# Altium footprint library 13-IC Packages-1bga.PcbLib: 97 footprints (part 8 of 14) (continued)
## BGA676C100P26X26_2700X2700X324 [mm] "BGA, 1.00mm Pitch, Square; 676 Pin, 26 Columns X 26 Rows, 27.00mm X 27.00mm X 2.60mm H" (continued)
  round 1 smd paste-0.51 mask+0.5: FTG1(-14.35,-14.35) FTG2(14.35,14.35)
Top Layer keep-out:
  circle w0.1: c-14.35,-14.35 r1
  circle w0.1: c14.35,14.35 r1
Top Overlay:
  circle w0.25: c-14.1,12.5 r0.125
  lines w0.2: -13.5,12.5 -12.5,13.5 ; -13.5,12.7 -12.7,13.5 ; -13.5,12.9 -12.9,13.5 ; -13.5,13.1 -13.1,13.5 ; -13.5,13.3 -13.3,13.5 ; -13.5,-13.5 13.5,-13.5 13.5,13.5 -13.5,13.5 -13.5,-13.5
Mechanical 14:
  lines w0.1: -13.5,12.5 -12.5,13.5 ; -13.5,12.6 -12.6,13.5 ; -13.5,12.7 -12.7,13.5 ; -13.5,12.8 -12.8,13.5 ; -13.5,12.9 -12.9,13.5 ; -13.5,13 -13,13.5 ; -13.5,13.1 -13.1,13.5 ; -13.5,13.2 -13.2,13.5 ; -13.5,13.3 -13.3,13.5 ; -13.5,13.4 -13.4,13.5 ; -13.5,-13.5 13.5,-13.5 13.5,13.5 -13.5,13.5 -13.5,-13.5
  text "26" at 12.7,14 h0.6
  text "25" at 11.7,14 h0.6
  text "24" at 10.7,14 h0.6
  text "23" at 9.7,14 h0.6
  text "2" at -11.25,14 h0.6
  text "3" at -10.25,14 h0.6
  text "4" at -9.25,14 h0.6
  text "5" at -8.25,14 h0.6
  text "16" at 2.75,14 h0.6
  text "15" at 1.75,14 h0.6
  text "14" at 0.75,14 h0.6
  text "13" at -0.25,14 h0.6
  text "12" at -1.25,14 h0.6
  text "11" at -2.25,14 h0.6
  text "10" at -3.25,14 h0.6
  text "9" at -4.25,14 h0.6
  text "8" at -5.25,14 h0.6
  text "7" at -6.25,14 h0.6
  text "6" at -7.25,14 h0.6
  text "1" at -12.25,14 h0.6
  text "18" at 4.75,14 h0.6
  text "19" at 5.75,14 h0.6
  text "20" at 6.75,14 h0.6
  text "21" at 7.75,14 h0.6
  text "22" at 8.7,14 h0.6
  text "17" at 3.75,14 h0.6
  text "AB" at -14.9,-8.8 h0.6
  text "AA" at -14.9,-7.8 h0.6
  text "Y" at -14.4,-6.8 h0.6
  text "W" at -14.4,-5.8 h0.6
  text "V" at -14.4,-4.8 h0.6
  text "U" at -14.4,-3.8 h0.6
  text "T" at -14.4,-2.8 h0.6
  text "R" at -14.4,-1.8 h0.6
  text "P" at -14.4,-0.8 h0.6
  text "N" at -14.4,0.2 h0.6
  text "M" at -14.4,1.2 h0.6
  text "L" at -14.4,2.2 h0.6
  text "K" at -14.4,3.2 h0.6
  text "J" at -14.4,4.2 h0.6
  text "H" at -14.4,5.2 h0.6
  text "G" at -14.4,6.2 h0.6
  text "F" at -14.4,7.2 h0.6
  text "E" at -14.4,8.2 h0.6
  text "D" at -14.4,9.2 h0.6
  text "C" at -14.4,10.2 h0.6
  text "B" at -14.4,11.2 h0.6
  text "A" at -14.4,12.2 h0.6
  text "AC" at -14.9,-9.8 h0.6
  text "AD" at -14.9,-10.8 h0.6
  text "AE" at -14.9,-11.8 h0.6
  text "AF" at -14.9,-12.8 h0.6
Mechanical 15:
  lines w0.05: -0.5,0 0.5,0 ; 0,-0.5 0,0.5 ; -15.5,-15.5 15.5,-15.5 15.5,15.5 -15.5,15.5 -15.5,-15.5
3D body "BGA676C100P26X26_2700X2700X324.stp": height 3.24, standoff 0, extent -13.5,-13.5 13.5,13.5

## BGA841C80P29X29_2400X2400X342 [mm] "BGA, 0.80mm pitch,square;841 pin, 29 columns X 29 rows, 24.00mm X 24.00mm X 3.42mm H"
height 3.42
pads (843):
  round 0.45 smd: A1(-11.2,11.2) A2(-10.4,11.2) A3(-9.6,11.2) A4(-8.8,11.2) A5(-8,11.2) A6(-7.2,11.2) A7(-6.4,11.2) A8(-5.6,11.2) A9(-4.8,11.2) A10(-4,11.2) A11(-3.2,11.2) A12(-2.4,11.2) A13(-1.6,11.2) A14(-0.8,11.2) A15(0,11.2) A16(0.8,11.2) A17(1.6,11.2) A18(2.4,11.2) A19(3.2,11.2) A20(4,11.2) A21(4.8,11.2) A22(5.6,11.2) A23(6.4,11.2) A24(7.2,11.2) A25(8,11.2) A26(8.8,11.2) A27(9.6,11.2) A28(10.4,11.2) A29(11.2,11.2) AA1(-11.2,-4.8) AA2(-10.4,-4.8) AA3(-9.6,-4.8) AA4(-8.8,-4.8) AA5(-8,-4.8) AA6(-7.2,-4.8) AA7(-6.4,-4.8) AA8(-5.6,-4.8) AA9(-4.8,-4.8) AA10(-4,-4.8) AA11(-3.2,-4.8) AA12(-2.4,-4.8) AA13(-1.6,-4.8) AA14(-0.8,-4.8) AA15(0,-4.8) AA16(0.8,-4.8) AA17(1.6,-4.8) AA18(2.4,-4.8) AA19(3.2,-4.8) AA20(4,-4.8) AA21(4.8,-4.8) AA22(5.6,-4.8) AA23(6.4,-4.8) AA24(7.2,-4.8) AA25(8,-4.8) AA26(8.8,-4.8) AA27(9.6,-4.8) AA28(10.4,-4.8) AA29(11.2,-4.8) AB1(-11.2,-5.6) AB2(-10.4,-5.6) AB3(-9.6,-5.6) AB4(-8.8,-5.6) AB5(-8,-5.6) AB6(-7.2,-5.6) AB7(-6.4,-5.6) AB8(-5.6,-5.6) AB9(-4.8,-5.6) AB10(-4,-5.6) AB11(-3.2,-5.6) AB12(-2.4,-5.6) AB13(-1.6,-5.6) AB14(-0.8,-5.6) AB15(0,-5.6) AB16(0.8,-5.6) AB17(1.6,-5.6) AB18(2.4,-5.6) AB19(3.2,-5.6) AB20(4,-5.6) AB21(4.8,-5.6) AB22(5.6,-5.6) AB23(6.4,-5.6) AB24(7.2,-5.6) AB25(8,-5.6) AB26(8.8,-5.6) AB27(9.6,-5.6) AB28(10.4,-5.6) AB29(11.2,-5.6) AC1(-11.2,-6.4) AC2(-10.4,-6.4) AC3(-9.6,-6.4) AC4(-8.8,-6.4) AC5(-8,-6.4) AC6(-7.2,-6.4) AC7(-6.4,-6.4) AC8(-5.6,-6.4) AC9(-4.8,-6.4) AC10(-4,-6.4) AC11(-3.2,-6.4) AC12(-2.4,-6.4) AC13(-1.6,-6.4) AC14(-0.8,-6.4) AC15(0,-6.4) AC16(0.8,-6.4) AC17(1.6,-6.4) AC18(2.4,-6.4) AC19(3.2,-6.4) AC20(4,-6.4) AC21(4.8,-6.4) AC22(5.6,-6.4) AC23(6.4,-6.4) AC24(7.2,-6.4) AC25(8,-6.4) AC26(8.8,-6.4) AC27(9.6,-6.4) AC28(10.4,-6.4) AC29(11.2,-6.4) AD1(-11.2,-7.2) AD2(-10.4,-7.2) AD3(-9.6,-7.2) AD4(-8.8,-7.2) AD5(-8,-7.2) AD6(-7.2,-7.2) AD7(-6.4,-7.2) AD8(-5.6,-7.2) AD9(-4.8,-7.2) AD10(-4,-7.2) AD11(-3.2,-7.2) AD12(-2.4,-7.2) AD13(-1.6,-7.2) AD14(-0.8,-7.2) AD15(0,-7.2) AD16(0.8,-7.2) AD17(1.6,-7.2) AD18(2.4,-7.2) AD19(3.2,-7.2) AD20(4,-7.2) AD21(4.8,-7.2) AD22(5.6,-7.2) AD23(6.4,-7.2) AD24(7.2,-7.2) AD25(8,-7.2) AD26(8.8,-7.2) AD27(9.6,-7.2) AD28(10.4,-7.2) AD29(11.2,-7.2) AE1(-11.2,-8) AE2(-10.4,-8) AE3(-9.6,-8) AE4(-8.8,-8) AE5(-8,-8) AE6(-7.2,-8) AE7(-6.4,-8) AE8(-5.6,-8) AE9(-4.8,-8) AE10(-4,-8) AE11(-3.2,-8) AE12(-2.4,-8) AE13(-1.6,-8) AE14(-0.8,-8) AE15(0,-8) AE16(0.8,-8) AE17(1.6,-8) AE18(2.4,-8) AE19(3.2,-8) AE20(4,-8) AE21(4.8,-8) AE22(5.6,-8) AE23(6.4,-8) AE24(7.2,-8) AE25(8,-8) AE26(8.8,-8) AE27(9.6,-8) AE28(10.4,-8) AE29(11.2,-8) AF1(-11.2,-8.8) AF2(-10.4,-8.8) AF3(-9.6,-8.8) AF4(-8.8,-8.8) AF5(-8,-8.8) AF6(-7.2,-8.8) AF7(-6.4,-8.8) AF8(-5.6,-8.8) AF9(-4.8,-8.8) AF10(-4,-8.8) AF11(-3.2,-8.8) AF12(-2.4,-8.8) AF13(-1.6,-8.8) AF14(-0.8,-8.8) AF15(0,-8.8) AF16(0.8,-8.8) AF17(1.6,-8.8) AF18(2.4,-8.8) AF19(3.2,-8.8) AF20(4,-8.8) AF21(4.8,-8.8) AF22(5.6,-8.8) AF23(6.4,-8.8) AF24(7.2,-8.8) AF25(8,-8.8) AF26(8.8,-8.8) AF27(9.6,-8.8) AF28(10.4,-8.8) AF29(11.2,-8.8) AG1(-11.2,-9.6) AG2(-10.4,-9.6) AG3(-9.6,-9.6) AG4(-8.8,-9.6) AG5(-8,-9.6) AG6(-7.2,-9.6) AG7(-6.4,-9.6) AG8(-5.6,-9.6) AG9(-4.8,-9.6) AG10(-4,-9.6) AG11(-3.2,-9.6) AG12(-2.4,-9.6) AG13(-1.6,-9.6) AG14(-0.8,-9.6) AG15(0,-9.6) AG16(0.8,-9.6) AG17(1.6,-9.6) AG18(2.4,-9.6) AG19(3.2,-9.6) AG20(4,-9.6) AG21(4.8,-9.6) AG22(5.6,-9.6) AG23(6.4,-9.6) AG24(7.2,-9.6) AG25(8,-9.6) AG26(8.8,-9.6) AG27(9.6,-9.6) AG28(10.4,-9.6) AG29(11.2,-9.6) AH1(-11.2,-10.4) AH2(-10.4,-10.4) AH3(-9.6,-10.4) AH4(-8.8,-10.4) AH5(-8,-10.4) AH6(-7.2,-10.4) AH7(-6.4,-10.4) AH8(-5.6,-10.4) AH9(-4.8,-10.4) AH10(-4,-10.4) AH11(-3.2,-10.4) AH12(-2.4,-10.4) AH13(-1.6,-10.4) AH14(-0.8,-10.4) AH15(0,-10.4) AH16(0.8,-10.4) AH17(1.6,-10.4) AH18(2.4,-10.4) AH19(3.2,-10.4) AH20(4,-10.4) AH21(4.8,-10.4) AH22(5.6,-10.4) AH23(6.4,-10.4) AH24(7.2,-10.4) AH25(8,-10.4) AH26(8.8,-10.4) AH27(9.6,-10.4) AH28(10.4,-10.4) AH29(11.2,-10.4) AJ1(-11.2,-11.2) AJ2(-10.4,-11.2) AJ3(-9.6,-11.2) AJ4(-8.8,-11.2) AJ5(-8,-11.2) AJ6(-7.2,-11.2) AJ7(-6.4,-11.2) AJ8(-5.6,-11.2) AJ9(-4.8,-11.2) AJ10(-4,-11.2) AJ11(-3.2,-11.2) AJ12(-2.4,-11.2) AJ13(-1.6,-11.2) AJ14(-0.8,-11.2) AJ15(0,-11.2) AJ16(0.8,-11.2) AJ17(1.6,-11.2) AJ18(2.4,-11.2) AJ19(3.2,-11.2) AJ20(4,-11.2) AJ21(4.8,-11.2) AJ22(5.6,-11.2) AJ23(6.4,-11.2) AJ24(7.2,-11.2) AJ25(8,-11.2) AJ26(8.8,-11.2) AJ27(9.6,-11.2) AJ28(10.4,-11.2) AJ29(11.2,-11.2) B1(-11.2,10.4) B2(-10.4,10.4) B3(-9.6,10.4) B4(-8.8,10.4) B5(-8,10.4) B6(-7.2,10.4) B7(-6.4,10.4) B8(-5.6,10.4) B9(-4.8,10.4) B10(-4,10.4) B11(-3.2,10.4) B12(-2.4,10.4) B13(-1.6,10.4) B14(-0.8,10.4) B15(0,10.4) B16(0.8,10.4) B17(1.6,10.4) B18(2.4,10.4) B19(3.2,10.4) B20(4,10.4) B21(4.8,10.4) B22(5.6,10.4) B23(6.4,10.4) B24(7.2,10.4) B25(8,10.4) B26(8.8,10.4) B27(9.6,10.4) B28(10.4,10.4) B29(11.2,10.4) C1(-11.2,9.6) C2(-10.4,9.6) C3(-9.6,9.6) C4(-8.8,9.6) C5(-8,9.6) C6(-7.2,9.6) C7(-6.4,9.6) C8(-5.6,9.6) C9(-4.8,9.6) C10(-4,9.6) C11(-3.2,9.6) C12(-2.4,9.6) C13(-1.6,9.6) C14(-0.8,9.6) C15(0,9.6) C16(0.8,9.6) C17(1.6,9.6) C18(2.4,9.6) C19(3.2,9.6) C20(4,9.6) C21(4.8,9.6) C22(5.6,9.6) C23(6.4,9.6) C24(7.2,9.6) C25(8,9.6) C26(8.8,9.6) C27(9.6,9.6) C28(10.4,9.6) C29(11.2,9.6) D1(-11.2,8.8) D2(-10.4,8.8) D3(-9.6,8.8) D4(-8.8,8.8) D5(-8,8.8) D6(-7.2,8.8) D7(-6.4,8.8) D8(-5.6,8.8) D9(-4.8,8.8) D10(-4,8.8) D11(-3.2,8.8) D12(-2.4,8.8) D13(-1.6,8.8) D14(-0.8,8.8) D15(0,8.8) D16(0.8,8.8) D17(1.6,8.8) D18(2.4,8.8) D19(3.2,8.8) D20(4,8.8) D21(4.8,8.8) D22(5.6,8.8) D23(6.4,8.8) D24(7.2,8.8) D25(8,8.8) D26(8.8,8.8) D27(9.6,8.8) D28(10.4,8.8) D29(11.2,8.8) E1(-11.2,8) E2(-10.4,8) E3(-9.6,8) E4(-8.8,8) E5(-8,8) E6(-7.2,8) E7(-6.4,8) E8(-5.6,8) E9(-4.8,8) E10(-4,8) E11(-3.2,8) E12(-2.4,8) E13(-1.6,8) E14(-0.8,8) E15(0,8) E16(0.8,8) E17(1.6,8) E18(2.4,8) E19(3.2,8) E20(4,8) E21(4.8,8) E22(5.6,8) E23(6.4,8) E24(7.2,8) E25(8,8) E26(8.8,8) E27(9.6,8) E28(10.4,8) E29(11.2,8) F1(-11.2,7.2) F2(-10.4,7.2) F3(-9.6,7.2) F4(-8.8,7.2) F5(-8,7.2) F6(-7.2,7.2) F7(-6.4,7.2) F8(-5.6,7.2) F9(-4.8,7.2) F10(-4,7.2) F11(-3.2,7.2) F12(-2.4,7.2) F13(-1.6,7.2) F14(-0.8,7.2) F15(0,7.2) F16(0.8,7.2) F17(1.6,7.2) F18(2.4,7.2) F19(3.2,7.2) F20(4,7.2) F21(4.8,7.2) F22(5.6,7.2) F23(6.4,7.2) F24(7.2,7.2) F25(8,7.2) F26(8.8,7.2) F27(9.6,7.2) F28(10.4,7.2) F29(11.2,7.2) G1(-11.2,6.4) G2(-10.4,6.4) G3(-9.6,6.4) G4(-8.8,6.4) G5(-8,6.4) G6(-7.2,6.4) G7(-6.4,6.4) G8(-5.6,6.4) G9(-4.8,6.4) G10(-4,6.4) G11(-3.2,6.4) G12(-2.4,6.4) G13(-1.6,6.4) G14(-0.8,6.4) G15(0,6.4) G16(0.8,6.4) G17(1.6,6.4) G18(2.4,6.4) G19(3.2,6.4) G20(4,6.4) G21(4.8,6.4) G22(5.6,6.4) G23(6.4,6.4) G24(7.2,6.4) G25(8,6.4) G26(8.8,6.4) G27(9.6,6.4) G28(10.4,6.4) G29(11.2,6.4) H1(-11.2,5.6) H2(-10.4,5.6) H3(-9.6,5.6) H4(-8.8,5.6) H5(-8,5.6) H6(-7.2,5.6) H7(-6.4,5.6) H8(-5.6,5.6) H9(-4.8,5.6) H10(-4,5.6) H11(-3.2,5.6) H12(-2.4,5.6) H13(-1.6,5.6) H14(-0.8,5.6) H15(0,5.6) H16(0.8,5.6) H17(1.6,5.6) H18(2.4,5.6) H19(3.2,5.6) H20(4,5.6) H21(4.8,5.6) H22(5.6,5.6) H23(6.4,5.6) H24(7.2,5.6) H25(8,5.6) H26(8.8,5.6) H27(9.6,5.6) H28(10.4,5.6) H29(11.2,5.6) J1(-11.2,4.8) J2(-10.4,4.8) J3(-9.6,4.8) J4(-8.8,4.8) J5(-8,4.8) J6(-7.2,4.8) J7(-6.4,4.8) J8(-5.6,4.8) J9(-4.8,4.8) J10(-4,4.8) J11(-3.2,4.8) J12(-2.4,4.8) J13(-1.6,4.8) J14(-0.8,4.8) J15(0,4.8) J16(0.8,4.8) J17(1.6,4.8) J18(2.4,4.8) J19(3.2,4.8) J20(4,4.8) J21(4.8,4.8) J22(5.6,4.8) J23(6.4,4.8) J24(7.2,4.8) J25(8,4.8) J26(8.8,4.8) J27(9.6,4.8) J28(10.4,4.8) J29(11.2,4.8) K1(-11.2,4) K2(-10.4,4) K3(-9.6,4) K4(-8.8,4) K5(-8,4) K6(-7.2,4) K7(-6.4,4) K8(-5.6,4) K9(-4.8,4) K10(-4,4) K11(-3.2,4) K12(-2.4,4) K13(-1.6,4) K14(-0.8,4) K15(0,4) K16(0.8,4) K17(1.6,4) K18(2.4,4) K19(3.2,4) K20(4,4) K21(4.8,4) K22(5.6,4) K23(6.4,4) K24(7.2,4) K25(8,4) K26(8.8,4) K27(9.6,4) K28(10.4,4) K29(11.2,4) L1(-11.2,3.2) L2(-10.4,3.2) L3(-9.6,3.2) L4(-8.8,3.2) L5(-8,3.2) L6(-7.2,3.2) L7(-6.4,3.2) L8(-5.6,3.2) L9(-4.8,3.2) L10(-4,3.2) L11(-3.2,3.2) L12(-2.4,3.2) L13(-1.6,3.2) L14(-0.8,3.2) L15(0,3.2) L16(0.8,3.2) L17(1.6,3.2) L18(2.4,3.2) L19(3.2,3.2) L20(4,3.2) L21(4.8,3.2) L22(5.6,3.2) L23(6.4,3.2) L24(7.2,3.2) L25(8,3.2) L26(8.8,3.2) L27(9.6,3.2) L28(10.4,3.2) L29(11.2,3.2) M1(-11.2,2.4) M2(-10.4,2.4) M3(-9.6,2.4) M4(-8.8,2.4) M5(-8,2.4) M6(-7.2,2.4) M7(-6.4,2.4) M8(-5.6,2.4) M9(-4.8,2.4) M10(-4,2.4) M11(-3.2,2.4) M12(-2.4,2.4) M13(-1.6,2.4) M14(-0.8,2.4) M15(0,2.4) M16(0.8,2.4) M17(1.6,2.4) M18(2.4,2.4) M19(3.2,2.4) M20(4,2.4) M21(4.8,2.4) M22(5.6,2.4) M23(6.4,2.4) M24(7.2,2.4) M25(8,2.4) M26(8.8,2.4) M27(9.6,2.4) M28(10.4,2.4) M29(11.2,2.4) N1(-11.2,1.6) N2(-10.4,1.6) N3(-9.6,1.6) N4(-8.8,1.6) N5(-8,1.6) N6(-7.2,1.6) N7(-6.4,1.6) N8(-5.6,1.6) N9(-4.8,1.6) N10(-4,1.6) N11(-3.2,1.6) N12(-2.4,1.6) N13(-1.6,1.6) N14(-0.8,1.6) N15(0,1.6) N16(0.8,1.6) N17(1.6,1.6) N18(2.4,1.6) N19(3.2,1.6) N20(4,1.6) N21(4.8,1.6) N22(5.6,1.6) N23(6.4,1.6) N24(7.2,1.6) N25(8,1.6) N26(8.8,1.6) N27(9.6,1.6) N28(10.4,1.6) N29(11.2,1.6) P1(-11.2,0.8) P2(-10.4,0.8) P3(-9.6,0.8) P4(-8.8,0.8) P5(-8,0.8) P6(-7.2,0.8) P7(-6.4,0.8) P8(-5.6,0.8) P9(-4.8,0.8) P10(-4,0.8) P11(-3.2,0.8) P12(-2.4,0.8) P13(-1.6,0.8) P14(-0.8,0.8) P15(0,0.8) P16(0.8,0.8) P17(1.6,0.8) P18(2.4,0.8) P19(3.2,0.8) P20(4,0.8) P21(4.8,0.8) P22(5.6,0.8) P23(6.4,0.8) P24(7.2,0.8) P25(8,0.8) P26(8.8,0.8) P27(9.6,0.8) P28(10.4,0.8) P29(11.2,0.8) R1(-11.2,0) R2(-10.4,0) R3(-9.6,0) R4(-8.8,0) R5(-8,0) R6(-7.2,0) R7(-6.4,0) R8(-5.6,0) R9(-4.8,0) R10(-4,0) R11(-3.2,0) R12(-2.4,0) R13(-1.6,0) R14(-0.8,0) R15(0,0) R16(0.8,0) R17(1.6,0) R18(2.4,0) R19(3.2,0) R20(4,0) R21(4.8,0) R22(5.6,0) R23(6.4,0) R24(7.2,0) R25(8,0) R26(8.8,0) R27(9.6,0) R28(10.4,0) R29(11.2,0) T1(-11.2,-0.8) T2(-10.4,-0.8) T3(-9.6,-0.8) T4(-8.8,-0.8) T5(-8,-0.8) T6(-7.2,-0.8) T7(-6.4,-0.8) T8(-5.6,-0.8) T9(-4.8,-0.8) T10(-4,-0.8) T11(-3.2,-0.8) T12(-2.4,-0.8) T13(-1.6,-0.8) T14(-0.8,-0.8) T15(0,-0.8) T16(0.8,-0.8) T17(1.6,-0.8) T18(2.4,-0.8) T19(3.2,-0.8) T20(4,-0.8) T21(4.8,-0.8) T22(5.6,-0.8) T23(6.4,-0.8) T24(7.2,-0.8) T25(8,-0.8) T26(8.8,-0.8) T27(9.6,-0.8) T28(10.4,-0.8) T29(11.2,-0.8) U1(-11.2,-1.6) U2(-10.4,-1.6) U3(-9.6,-1.6) U4(-8.8,-1.6) U5(-8,-1.6) U6(-7.2,-1.6) U7(-6.4,-1.6) U8(-5.6,-1.6) U9(-4.8,-1.6) U10(-4,-1.6) U11(-3.2,-1.6) U12(-2.4,-1.6) U13(-1.6,-1.6) U14(-0.8,-1.6) U15(0,-1.6) U16(0.8,-1.6) U17(1.6,-1.6) U18(2.4,-1.6) U19(3.2,-1.6) U20(4,-1.6) U21(4.8,-1.6) U22(5.6,-1.6) U23(6.4,-1.6) U24(7.2,-1.6) U25(8,-1.6) U26(8.8,-1.6) U27(9.6,-1.6) U28(10.4,-1.6) U29(11.2,-1.6) V1(-11.2,-2.4) V2(-10.4,-2.4) V3(-9.6,-2.4) V4(-8.8,-2.4) V5(-8,-2.4) V6(-7.2,-2.4) V7(-6.4,-2.4) V8(-5.6,-2.4) V9(-4.8,-2.4) V10(-4,-2.4) V11(-3.2,-2.4) V12(-2.4,-2.4) V13(-1.6,-2.4) V14(-0.8,-2.4) V15(0,-2.4) V16(0.8,-2.4) V17(1.6,-2.4) V18(2.4,-2.4) V19(3.2,-2.4) V20(4,-2.4) V21(4.8,-2.4) V22(5.6,-2.4) V23(6.4,-2.4) V24(7.2,-2.4) V25(8,-2.4) V26(8.8,-2.4) V27(9.6,-2.4) V28(10.4,-2.4) V29(11.2,-2.4) W1(-11.2,-3.2) W2(-10.4,-3.2) W3(-9.6,-3.2) W4(-8.8,-3.2) W5(-8,-3.2) W6(-7.2,-3.2) W7(-6.4,-3.2) W8(-5.6,-3.2) W9(-4.8,-3.2) W10(-4,-3.2) W11(-3.2,-3.2) W12(-2.4,-3.2) W13(-1.6,-3.2) W14(-0.8,-3.2) W15(0,-3.2) W16(0.8,-3.2) W17(1.6,-3.2) W18(2.4,-3.2) W19(3.2,-3.2) W20(4,-3.2) W21(4.8,-3.2) W22(5.6,-3.2) W23(6.4,-3.2) W24(7.2,-3.2) W25(8,-3.2) W26(8.8,-3.2) W27(9.6,-3.2) W28(10.4,-3.2) W29(11.2,-3.2) Y1(-11.2,-4) Y2(-10.4,-4) Y3(-9.6,-4) Y4(-8.8,-4) Y5(-8,-4) Y6(-7.2,-4) Y7(-6.4,-4) Y8(-5.6,-4) Y9(-4.8,-4) Y10(-4,-4) Y11(-3.2,-4) Y12(-2.4,-4) Y13(-1.6,-4) Y14(-0.8,-4) Y15(0,-4) Y16(0.8,-4) Y17(1.6,-4) Y18(2.4,-4) Y19(3.2,-4) Y20(4,-4) Y21(4.8,-4) Y22(5.6,-4) Y23(6.4,-4) Y24(7.2,-4) Y25(8,-4) Y26(8.8,-4) Y27(9.6,-4) Y28(10.4,-4) Y29(11.2,-4)
  round 1 smd paste-0.51 mask+0.5: FTG1(-12.85,-12.85) FTG2(12.85,12.85)
Top Layer keep-out:
  circle w0.1: c12.85,12.85 r1
  circle w0.1: c-12.85,-12.85 r1
Top Overlay:
  circle w0.25: c-12.6,11.2 r0.125
  lines w0.2: -12,-12 12,-12 12,12 -12,12 -12,-12
Mechanical 14:
  lines w0.1: -12,11 -11,12 ; -12,11.1 -11.1,12 ; -12,11.2 -11.2,12 ; -12,11.3 -11.3,12 ; -12,11.4 -11.4,12 ; -12,11.5 -11.5,12 ; -12,11.6 -11.6,12 ; -12,11.7 -11.7,12 ; -12,11.8 -11.8,12 ; -12,11.9 -11.9,12 ; -12,-12 12,-12 12,12 -12,12 -12,-12
  text "AJ" at -13.335,-11.5 h0.6
  text "AH" at -13.335,-10.7 h0.6
  text "AG" at -13.335,-9.9 h0.6
  text "AF" at -13.335,-9.1 h0.6
  text "AE" at -13.335,-8.3 h0.6
  text "AD" at -13.335,-7.5 h0.6
  text "AC" at -13.335,-6.7 h0.6
  text "AB" at -13.335,-5.9 h0.6
  text "AA" at -13.335,-5.1 h0.6
  text "Y" at -12.7,-4.3 h0.6
  text "W" at -12.7,-3.5 h0.6
  text "A" at -12.7,10.9 h0.6
  text "B" at -12.7,10.1 h0.6
  text "C" at -12.7,9.3 h0.6
  text "D" at -12.7,8.5 h0.6
  text "E" at -12.7,7.7 h0.6
  text "F" at -12.7,6.9 h0.6
  text "G" at -12.7,6.1 h0.6
  text "H" at -12.7,5.3 h0.6
  text "J" at -12.7,4.5 h0.6
  text "K" at -12.7,3.7 h0.6
  text "L" at -12.7,2.9 h0.6
  text "M" at -12.7,2.1 h0.6
  text "N" at -12.7,1.3 h0.6
  text "P" at -12.7,0.5 h0.6
  text "R" at -12.7,-0.3 h0.6
  text "T" at -12.7,-1.1 h0.6
  text "U" at -12.7,-1.9 h0.6
  text "V" at -12.7,-2.7 h0.6
  text "18" at 2.65,12.3 h0.6
  text "17" at 1.85,12.3 h0.6
  text "16" at 1.05,12.3 h0.6
  text "15" at 0.25,12.3 h0.6
  text "14" at -0.55,12.3 h0.6
  text "13" at -1.35,12.3 h0.6
  text "12" at -2.15,12.3 h0.6
  text "11" at -2.95,12.3 h0.6
  text "10" at -3.75,12.3 h0.6
  text "9" at -4.55,12.3 h0.6
  text "8" at -5.35,12.3 h0.6
  text "7" at -6.15,12.3 h0.6
  text "6" at -6.95,12.3 h0.6
  text "5" at -7.75,12.3 h0.6
  text "4" at -8.55,12.3 h0.6
  text "3" at -9.35,12.3 h0.6
  text "2" at -10.15,12.3 h0.6
  text "1" at -10.95,12.3 h0.6
  text "19" at 3.45,12.3 h0.6
  text "20" at 4.25,12.3 h0.6
  text "21" at 5.05,12.3 h0.6
  text "22" at 5.85,12.3 h0.6
  text "23" at 6.65,12.3 h0.6
  text "24" at 7.45,12.3 h0.6
  text "25" at 8.25,12.3 h0.6
  text "26" at 9.05,12.3 h0.6
  text "27" at 9.85,12.3 h0.6
  text "28" at 10.65,12.3 h0.6
  text "29" at 11.45,12.3 h0.6
Mechanical 15:
  circle w0.05: c0,0 r0.35
  lines w0.05: -0.5,0 0.5,0 ; 0,-0.5 0,0.5 ; -13.05,-13.05 13.05,-13.05 13.05,13.05 -13.05,13.05 -13.05,-13.05
3D body "BGA841C80P29X29_2400X2400X342.stp": height 3.43, standoff 0, extent -12.05,-12.05 12.05,12.05